# Altium footprint library Apalis Evaluation Board.PcbLib: 166 footprints (part 3 of 11)
Each footprint in its own frame and in the unit in brackets; x right, y up, seen from the top. Pads: shape width x height; smd on the part's side, far side on the other; paste and mask are expansions set on the pad; w line width, h text height; cw(c..) or ccw(c..) is an arc to the next point about the centre after c.
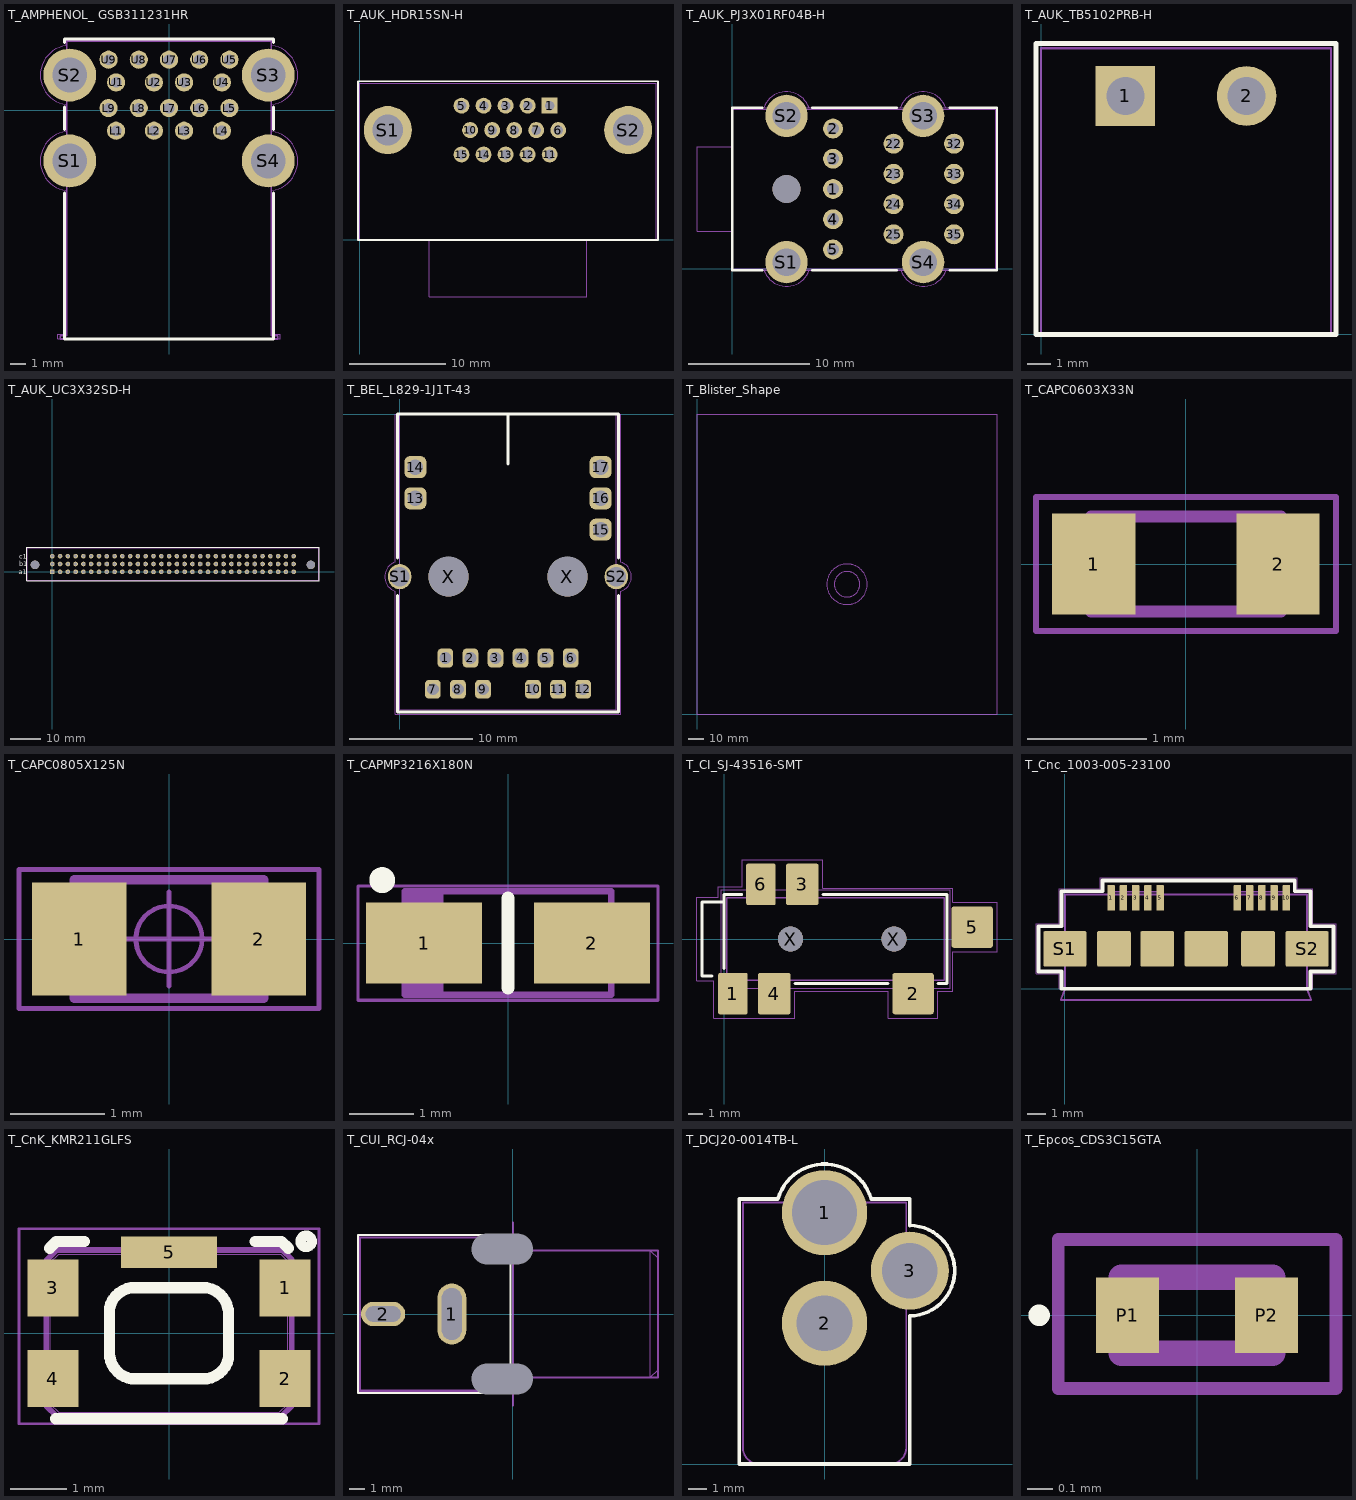
[diagram p2: the footprints below, top view; thin cyan lines are the x and y axes]

## T_AMPHENOL_ GSB311231HR [mm] "USB 3.0 double row, Type A"
height 15.5
pads (22):
  round 1.2 hole 0.7: L1(-3.5,-1.35) L2(-1,-1.35) L3(1,-1.35) L4(3.5,-1.35) L5(4,0.15) L6(2,0.15) L7(0,0.15) L8(-2,0.15) L9(-4,0.15) U1(-3.5,1.85) U2(-1,1.85) U3(1,1.85) U4(3.5,1.85) U5(4,3.35) U6(2,3.35) U7(0,3.35) U8(-2,3.35) U9(-4,3.35)
  round 3.5 hole 2.3: S1(-6.57,-3.35) S2(-6.57,2.33) S3(6.57,2.33) S4(6.57,-3.35)
Top Overlay:
  lines w0.2: -6.9,-5.48 -6.9,-15.13 6.9,-15.13 6.9,-5.48 ; -6.9,-1.28 -6.9,0.22 ; -6.9,4.5 -6.9,4.72 6.9,4.72 6.9,4.5 ; 6.9,-1.28 6.9,0.22
Mechanical 1:
  lines w0.05: -6.809,-5.293 -6.809,-14.83 -7.349,-14.83 -7.349,-15.13 7.349,-15.13 7.349,-14.83 6.81,-14.83 6.809,-5.292 ; -6.809,-1.405 -6.809,0.385 ; -6.809,-5.293 cw(c-6.565,-3.351) -6.809,-1.408 ; -6.809,0.387 cw(c-6.565,2.329) -6.809,4.272 -6.809,4.63 6.809,4.63 6.809,4.273 ; 6.809,-5.292 ccw(c6.565,-3.349) 6.809,-1.407 ; 6.809,0.388 ccw(c6.565,2.331) 6.809,4.273 ; 6.809,-1.405 6.809,0.385
Mechanical 2:
  lines w0.001: -6.753,4.57 6.747,4.57 ; -6.75,4.57 -6.75,-14.93 -7.2,-14.93 -7.2,-15.13 7.2,-15.13 7.2,-14.93 6.75,-14.93 6.75,4.57
Mechanical 3:
  lines w0.1: -7.2,-15.13 -7.2,-14.93 -6.75,-14.93 -6.75,4.57 6.75,4.57 6.75,-14.93 7.2,-14.93 7.2,-15.13 -7.2,-15.13

## T_AUK_HDR15SN-H [mm] "15 pin male D-SUB connector"
height 12.55
pads (17):
  rect 1.65x1.65 hole 1: 1(19.73,13.97)
  round 1.65 hole 1: 2(17.44,13.97) 3(15.15,13.97) 4(12.86,13.97) 5(10.57,13.97) 6(20.62,11.43) 7(18.33,11.43) 8(16.04,11.43) 9(13.75,11.43) 10(11.46,11.43) 11(19.73,8.89) 12(17.44,8.89) 13(15.15,8.89) 14(12.86,8.89) 15(10.57,8.89)
  round 5 hole 3.2: S1(2.9,11.43) S2(27.9,11.43)
Top Overlay:
  lines w0.2: -0.2,0 -0.2,16.505 31,16.505 31,0 -0.2,0
Mechanical 1:
  lines w0.05: 0,0 0,16.3 30.8,16.3 30.8,0 0,0
Mechanical 2:
  lines w0.001: 7.235,0 7.235,-5.9 23.565,-5.9 23.565,0 ; 30.8,0 30.8,16.3 0,16.3 0,0 30.819,0
Mechanical 3:
  lines w0.1: 0,0 30.8,0 30.8,16.3 0,16.3 0,0
3D body: height 12.6, standoff -3.17, extent -0.006,-5.893 30.81,16.231

## T_AUK_PJ3X01RF04B-H [mm] "Audio Jack Triple Stacked DIP Type"
height 37
pads (18):
  round 1.65 hole 1: 1(8.35,6.6) 2(8.35,11.6) 3(8.35,9.1) 4(8.35,4.1) 5(8.35,1.6) 22(13.35,10.35) 23(13.35,7.85) 24(13.35,5.35) 25(13.35,2.85) 32(18.35,10.35) 33(18.35,7.85) 34(18.35,5.35) 35(18.35,2.85)
  round 3.5 hole 2.3: S1(4.5,0.55) S2(4.5,12.65) S3(15.8,12.65) S4(15.8,0.55)
  round 2.3 hole 2.3 unplated: ""(4.5,6.6)
Top Overlay:
  lines w0.2: 0,-0.105 2.5,-0.105 ; 0,-0.082 0,13.305 2.5,13.305 ; 6.625,-0.105 13.625,-0.105 ; 6.625,13.305 13.625,13.305 ; 18,-0.105 21.903,-0.105 21.905,-0.105 21.905,13.305 18,13.305
Mechanical 1:
  lines w0.05: 2.604,13.299 cw(c4.484,12.666) 6.363,13.301 ; 2.604,13.3 0,13.3 0,-0.1 2.637,-0.1 ; 2.637,-0.101 ccw(c4.516,0.533) 6.396,-0.099 ; 6.363,13.3 13.904,13.3 ; 6.396,-0.1 13.937,-0.1 ; 13.904,13.299 cw(c15.784,12.666) 17.663,13.301 ; 13.937,-0.101 ccw(c15.816,0.533) 17.696,-0.099 ; 17.663,13.3 21.9,13.3 21.9,-0.1 17.696,-0.1
Mechanical 2:
  lines w0.001: 0,3.1 -2.9,3.1 -2.9,10.1 0,10.1 ; 0,0 0,13.2 21.8,13.2 21.8,0 0,0
Mechanical 3:
  lines w0.1: 0,-0.1 21.901,-0.1 ; 0,13.3 21.9,13.3 21.902,13.298 21.902,-0.1 ; 0.001,-0.074 0.001,13.326 ; 21.901,-0.1 21.902,-0.1
3D body: height 31.5, standoff 28.5, extent -2.905,5.105 0.01,8.093
3D body: height 19, standoff 16, extent -2.905,5.105 0.01,8.093
3D body: height 6.5, standoff 3.5, extent -2.905,5.105 0.01,8.093
3D body: height 21.01, standoff 13.99, extent -2.9,3.1 0,10.1
3D body: height 33.51, standoff 26.49, extent -2.9,3.1 0,10.1
3D body: height 8.51, standoff 1.49, extent -2.9,3.1 0,10.1
3D body: height 38.5, standoff 0, extent 0,0 21.8,13.2

## T_AUK_TB5102PRB-H [mm] "Power Connector 5.08mm pitch"
height 8.4
pads (2):
  rect 2.5x2.5 hole 1.6: 1(3.54,10)
  round 2.5 hole 1.6: 2(8.62,10)
Top Overlay:
  lines w0.2: -0.21,0 -0.21,12.2 12.37,12.2 12.37,0 -0.21,0
Mechanical 1:
  lines w0.05: 0,0 0,12 12.16,12 12.16,0 0,0
Mechanical 2:
  lines w0.001: 0,0 0,12 12.16,12 12.16,0 0,0
Mechanical 3:
  lines w0.1: 0,0 0,12 12.16,12 12.16,0 0,0
3D body: height 8.37, standoff -3.48, extent -0.16,0 11.82,12

## T_AUK_UC3X32SD-H [mm] "Header, 3x32 Pins, 2.54 mm pitch"
height 11.6
pads (98):
  rect 1.5x1.5 hole 1: A1(0,0)
  round 1.5 hole 1: A2(2.54,0) A3(5.08,0) A4(7.62,0) A5(10.16,0) A6(12.7,0) A7(15.24,0) A8(17.78,0) A9(20.32,0) A10(22.86,0) A11(25.4,0) A12(27.94,0) A13(30.48,0) A14(33.02,0) A15(35.56,0) A16(38.1,0) A17(40.64,0) A18(43.18,0) A19(45.72,0) A20(48.26,0) A21(50.8,0) A22(53.34,0) A23(55.88,0) A24(58.42,0) A25(60.96,0) A26(63.5,0) A27(66.04,0) A28(68.58,0) A29(71.12,0) A30(73.66,0) A31(76.2,0) A32(78.74,0) B1(0,2.54) B2(2.54,2.54) B3(5.08,2.54) B4(7.62,2.54) B5(10.16,2.54) B6(12.7,2.54) B7(15.24,2.54) B8(17.78,2.54) B9(20.32,2.54) B10(22.86,2.54) B11(25.4,2.54) B12(27.94,2.54) B13(30.48,2.54) B14(33.02,2.54) B15(35.56,2.54) B16(38.1,2.54) B17(40.64,2.54) B18(43.18,2.54) B19(45.72,2.54) B20(48.26,2.54) B21(50.8,2.54) B22(53.34,2.54) B23(55.88,2.54) B24(58.42,2.54) B25(60.96,2.54) B26(63.5,2.54) B27(66.04,2.54) B28(68.58,2.54) B29(71.12,2.54) B30(73.66,2.54) B31(76.2,2.54) B32(78.74,2.54) C1(0,5.08) C2(2.54,5.08) C3(5.08,5.08) C4(7.62,5.08) C5(10.16,5.08) C6(12.7,5.08) C7(15.24,5.08) C8(17.78,5.08) C9(20.32,5.08) C10(22.86,5.08) C11(25.4,5.08) C12(27.94,5.08) C13(30.48,5.08) C14(33.02,5.08) C15(35.56,5.08) C16(38.1,5.08) C17(40.64,5.08) C18(43.18,5.08) C19(45.72,5.08) C20(48.26,5.08) C21(50.8,5.08) C22(53.34,5.08) C23(55.88,5.08) C24(58.42,5.08) C25(60.96,5.08) C26(63.5,5.08) C27(66.04,5.08) C28(68.58,5.08) C29(71.12,5.08) C30(73.66,5.08) C31(76.2,5.08) C32(78.74,5.08)
  round 2.8 hole 2.8 unplated: ""(-5.63,2.24) ""(84.37,2.24)
Top Overlay:
  lines w0.2: -8.255,-2.885 -8.255,7.963 86.995,7.963 86.995,-2.885 -8.255,-2.885
  text "a1" at -10.847,-0.758 h1.52
  text "b1" at -10.84,1.778 h1.52
  text "c1" at -10.84,4.318 h1.52
Mechanical 1:
  lines w0.05: -8.205,-2.835 86.945,-2.835 86.945,7.915 -8.205,7.915 -8.205,-2.835
Mechanical 2:
  lines w0.001: -8.13,-2.71 86.87,-2.71 86.87,7.79 -8.13,7.79 -8.13,-2.71
Mechanical 3:
  lines w0.1: -8.13,-2.76 -8.13,7.84 86.87,7.84 86.87,-2.76 -8.13,-2.76
3D body: height 11.62, standoff -3.98, extent -8.13,-2.76 86.87,7.84

## T_BEL_L829-1J1T-43 [mil] "LOW PROFILE GIGABIT ETHERNET JACK WITH MAGS"
height 445
pads (21):
  rrect50% 50x60 hole 38: 1(146,-779.68) 2(226,-779.68) 3(306,-779.68) 4(386,-779.68) 5(466,-779.68) 6(546,-779.68) 7(106,-879.68) 8(186,-879.68) 9(266,-879.68) 10(426,-879.68) 11(506,-879.68) 12(586,-879.68)
  rrect50% 70x70 hole 50: 13(50,-269.69) 14(50,-169.69) 15(642,-369.69) 16(642,-269.69) 17(642,-169.69)
  oval 74x80 hole 62: S1(0,-519.68) S2(692,-519.68)
  round 128 hole 128 unplated: X(156,-519.68) X(536,-519.68)
Top Overlay:
  lines w10: -6.95,-579.68 -6.95,-951.77 699.02,-951.77 699.02,-579.68 ; -6.95,-459.49 -6.95,0 699.02,0 699.02,-460 ; 346,-159.69 346,-0.06 346.06,0
Mechanical 1:
  lines w1.97: -13.78,-473.23 -13.78,0 705.91,0 705.91,-473.24 ; -13.76,-473.28 ccw(c0.2,-519.71) -13.78,-566.13 -13.78,-958.66 705.91,-958.66 705.91,-566.09 ; 705.89,-566.05 ccw(c691.8,-519.66) 705.89,-473.28
Mechanical 2:
  lines w0.04: 0,-944.88 692.13,-944.88 692.13,0 0,0 0,-944.88
Mechanical 3:
  lines w3.94: 0,-944.88 692.13,-944.88 692.13,0 0,0 0,-944.88
3D body: height 494.05, standoff -150.89, extent -54.94,-946.68 746.36,19.67

## T_Blister_Shape [mm]
Mechanical 2:
  circle w0.254: c100,86.5 r8.5
  circle w0.254: c100,86.5 r13.5
Mechanical 15:
  lines w0.01: 0,0 200,0 200,200 0,200 0,0
3D body: height 24.9, standoff 22.4, extent 87.549,74.025 112.451,98.975
3D body: height 22.1, standoff 19.6, extent 88.047,74.524 111.953,98.476
3D body: height 19.3, standoff 16.8, extent 88.545,75.023 111.455,97.977
3D body: height 16.5, standoff 14, extent 89.043,75.522 110.957,97.478
3D body: height 13.7, standoff 11.2, extent 89.541,76.021 110.459,96.979
3D body: height 10.9, standoff 8.4, extent 90.039,76.52 109.961,96.48
3D body: height 27.7, standoff 25.2, extent 86.553,73.027 113.447,99.973
3D body: height 8.1, standoff 5.6, extent 90.537,77.019 109.463,95.981
3D body: height 5.3, standoff 2.8, extent 91.035,77.518 108.965,95.482
3D body: height 2.8, standoff 0, extent 91.534,78.017 108.466,94.983

## T_CAPC0603X33N [mm]
height 0.8
pads (2):
  rect 0.7x0.85 smd: 1(-0.775,0) 2(0.775,0)
Mechanical 1:
  lines w0.05: -1.261,-0.563 1.262,-0.563 1.262,0.563 -1.261,0.563 -1.261,-0.563
Mechanical 2:
  lines w0.001: -0.8,-0.4 0.8,-0.4 0.8,0.4 -0.8,0.4 -0.8,-0.4
Mechanical 3:
  lines w0.1: -0.8,-0.4 0.8,-0.4 0.8,0.4 -0.8,0.4 -0.8,-0.4
3D body: height 0.9, standoff 0, extent -0.8,-0.4 0.8,0.4

## T_CAPC0805X125N [mm]
height 1.25
pads (2):
  rect 1x1.2 smd: 1(-0.95,0) 2(0.95,0)
Mechanical 1:
  circle w0.05: c0,0 r0.35
  lines w0.05: -0.5,0 0.5,0 ; 0,-0.5 0,0.5 ; -1.586,-0.736 1.586,-0.736 1.586,0.736 -1.586,0.736 -1.586,-0.736
Mechanical 2:
  lines w0.001: -1,-0.625 -1,0.625 1,0.625 1,-0.625 -1,-0.625
Mechanical 3:
  lines w0.1: -1,-0.625 1,-0.625 1,0.625 -1,0.625 -1,-0.625
3D body: height 1.4, standoff 0, extent -1,-0.625 1,0.625

## T_CAPMP3216X180N [mm]
height 1.6
pads (2):
  rect 1.8x1.25 smd: 1(-1.3,0) 2(1.3,0)
Top Overlay:
  circle w0.3: c-1.95,0.975 r0.05
  lines w0.2: 0,-0.699 0,0.699
Mechanical 1:
  lines w0.05: -2.325,-0.886 2.325,-0.886 2.325,0.886 -2.325,0.886 -2.325,-0.886
Mechanical 2:
  lines w0.001: -1.6,-0.8 -1.6,0.8 1.6,0.8 1.6,-0.8 -1.6,-0.8
Mechanical 3:
  lines w0.1: -1.55,-0.8 -1.55,0.8 ; -1.45,-0.8 -1.45,0.8 ; -1.35,-0.8 -1.35,0.8 ; -1.25,-0.8 -1.25,0.8 ; -1.15,-0.8 -1.15,0.8 ; -1.05,-0.8 -1.05,0.8 ; -1.6,-0.8 -1.6,0.8 1.6,0.8 1.6,-0.8 -1.6,-0.8
3D body: height 1.6, standoff 0, extent -1.6,-0.8 -1,0.8
3D body: height 1.6, standoff 0, extent -1,-0.8 1.6,0.8

## T_CI_SJ-43516-SMT [mm] "STEREO_3.5mm AUDIO JACK  CUI"
height 5
pads (8):
  rrect12% 2x2.8 smd: 1(0.6,-3.7) 6(2.5,3.7)
  rrect12% 2.8x2.8 smd: 2(12.8,-3.7) 5(16.8,0.8)
  rrect12% 2.2x2.8 smd: 3(5.3,3.7) 4(3.4,-3.7)
  round 1.7 hole 1.7 unplated: X(4.5,0) X(11.5,0)
Top Overlay:
  lines w0.2: -0.8,-2.5 -1.5,-2.5 -1.5,2.5 0,2.5 ; 0,-2 0,3 1.2,3 ; 4.8,-3 11.1,-3 ; 6.7,3 15.1,3 15.1,-3 14.5,-3
Mechanical 1:
  lines w0.05: -1.83,-2.83 -0.68,-2.83 -0.68,-5.38 4.78,-5.38 4.78,-3.53 11.12,-3.53 11.12,-5.38 14.48,-5.38 14.48,-3.53 15.48,-3.53 15.48,-0.87 18.48,-0.87 18.48,2.48 15.48,2.48 15.48,3.45 6.68,3.45 6.68,5.38 1.22,5.38 1.22,3.53 -0.39,3.53 -0.39,2.83 -1.83,2.83 -1.83,-2.83
Mechanical 2:
  lines w0.001: -0.2,-3.35 15.3,-3.35 15.3,3.35 -0.2,3.35 -0.2,-3.35
Mechanical 3:
  lines w0.1: 0.2,-2.8 0.2,2.8 14.9,2.8 14.9,-2.8 0.2,-2.8

## T_Cnc_1003-005-23100 [mm] "USB Micro A/B 3.0"
height 2.92
pads (16):
  rrect12% 0.4x1.35 smd: 1(2.45,4.825) 2(3.1,4.825) 3(3.75,4.825) 4(4.4,4.825) 5(5.05,4.825) 6(9.15,4.825) 7(9.8,4.825) 8(10.45,4.825) 9(11.1,4.825) 10(11.75,4.825)
  rrect12% 2.3x1.9 smd: S1(0,2.125) S2(12.85,2.125) ""(7.5,2.125)
  rrect12% 1.8x1.9 smd: ""(2.6,2.125) ""(4.9,2.125) ""(10.25,2.125)
Top Overlay:
  lines w0.2: -1.4,0.925 -0.175,0.925 -0.175,0 13.025,0 13.025,0.925 14.25,0.925 14.25,3.325 13.025,3.325 13.025,5.175 12.2,5.175 12.2,5.755 2,5.755 2,5.175 -0.175,5.175 -0.175,3.325 -1.4,3.325 -1.4,0.925
Mechanical 1:
  lines w0.05: -1.535,0.79 -0.31,0.79 -0.31,0 13.16,0 13.16,0.79 14.385,0.79 14.385,3.46 13.16,3.46 13.16,5.31 12.335,5.31 12.335,5.89 1.865,5.89 1.865,5.31 -0.31,5.31 -0.31,3.46 -1.535,3.46 -1.535,0.79
Mechanical 2:
  lines w0.001: 0,1.675 -0.64,1.675 -0.64,2.575 0,2.575 ; 2.35,5 2.35,5.15 5.15,5.15 5.15,5 ; 9.05,5 9.05,5.15 11.85,5.15 11.85,5 ; 12.85,1.675 13.49,1.675 13.49,2.575 12.85,2.575 ; 0,0 12.85,0 ; 0,0 -0.22,-0.6 13.07,-0.6 12.85,0 ; 0,0 0,5 12.85,5 12.85,0
Mechanical 3:
  lines w0.1: 0,1.675 -0.64,1.675 -0.64,2.575 0,2.575 ; 2.35,5 2.35,5.15 5.15,5.15 5.15,5 ; 9.05,5 9.05,5.15 11.85,5.15 11.85,5 ; 12.85,1.675 13.49,1.675 13.49,2.575 12.85,2.575 ; 0,0 12.85,0 ; 0,0 0,5 12.85,5 12.85,0 ; 0,0 -0.22,-0.6 13.07,-0.6 12.85,0
3D body: height 2.78, standoff -0.24, extent -0.65,-0.624 13.5,5.05

## T_CnK_KMR211GLFS [mm] "Microminiature Tact Switch for SMT"
height 1.9
pads (5):
  rect 0.9x1 smd: 1(2.05,0.8) 2(2.05,-0.8) 3(-2.05,0.8) 4(-2.05,-0.8)
  rect 1.7x0.55 smd: 5(0,1.43)
Top Overlay:
  circle w0.18: c2.424,1.624 r0.1
  lines w0.2: -2.109,1.502 -1.991,1.62 -1.5,1.62 ; -2,-1.51 2,-1.51 ; -1.05,-0.36 -1.05,0.44 ; -1.05,-0.35 ccw(c-0.59,-0.35) -0.662,-0.804 ; -1.05,0.444 cw(c-0.6,0.35) -0.669,0.805 ; -0.66,0.805 0.66,0.805 ; -0.655,-0.805 0.65,-0.805 ; 0.669,-0.805 ccw(c0.6,-0.35) 1.05,-0.444 ; 0.684,0.8 cw(c0.59,0.35) 1.045,0.419 ; 1.05,-0.44 1.05,0.4 ; 1.52,1.621 1.989,1.621 2.108,1.502
Mechanical 1:
  lines w0.05: -2.65,-1.6 -2.65,1.845 2.65,1.845 2.65,-1.6 -2.65,-1.6
Mechanical 2:
  lines w0.001: -2.1,-1.25 -2.1,1.25 -1.95,1.4 1.97,1.4 2.1,1.27 2.1,-1.25 1.95,-1.4 -1.95,-1.4 -2.1,-1.25
Mechanical 3:
  lines w0.1: -2.17,-1.28 -2.17,1.28 -1.98,1.47 2,1.47 2.17,1.3 2.17,-1.28 1.98,-1.47 -1.98,-1.47 -2.17,-1.28

## T_CUI_RCJ-04x [mm] "Right Angle RCA Connector THT"
height 12.6
pads (4):
  oval 1.9x4 hole 1.3 slot 3.4 at 90 deg: 1(-4,0)
  oval 2.9x1.6 hole 1 slot 2.3 at 0 deg: 2(-8.5,0)
  round 0 hole 2 slot 4 at 0 deg: Hole1(-0.7,4.25) Hole2(-0.7,-4.25)
Top Overlay:
  lines w0.127: -0.147,5.165 -10.143,5.165 -10.143,-5.165 -0.146,-5.165 -0.146,5.144
Mechanical 1:
  lines w0.127: -10.123,-5.152 -10.123,5.185 0,5.185 0,-5.152 -10.123,-5.152
Mechanical 2:
  lines w0: 0,-5 0,5
  lines w0.001: 0,-5 -10,-5 -10,5 0,5 ; 0,-4.15 9,-4.15 ; 0,4.15 9,4.15 ; 9,-4.15 9,4.15 ; 9,-4.15 9.5,-3.65 9.5,3.65 9,4.15
Mechanical 3:
  lines w0.127: 0,-6 0,6 ; 0,-4.15 9.5,-4.15 9.5,4.15 0,4.15 ; -10,-5 -10,5 0,5 0,-5 -10,-5

## T_DCJ20-0014TB-L [mm] "Header, 1x2 Pins, 2.54 mm pitch, male"
height 10.7
pads (3):
  round 4.7 hole 3.58: 1(0,13.85)
  round 4.7 hole 3.07: 2(0,7.75)
  round 4.3 hole 3.07: 3(4.7,10.65)
Top Overlay:
  lines w0.2: -2.569,14.598 cw(c0,13.85) 2.569,14.6 4.7,14.6 4.7,13.142 cw(c4.675,10.65) 4.7,8.158 ; -2.569,14.6 -4.7,14.6 -4.7,0 4.675,0 ; 4.7,0 4.7,8.157
Mechanical 1:
  lines w0.05: 4.675,0 -4.7,0 -4.7,14.6 -2.568,14.6 cw(c0,13.85) 2.568,14.6 4.7,14.6 4.7,13.125 cw(c4.7,10.65) 4.7,8.175 4.7,0
Mechanical 2:
  lines w0.001: -1.4,13.95 -1.4,14.4 -4.5,14.4 -4.5,0.9 ccw(c-3.6,0.9) -3.6,0 3.6,0 ; 1.4,13.95 1.4,14.4 4.5,14.4 4.5,0.9 cw(c3.6,0.9) 3.6,0
Mechanical 3:
  lines w0.1: -4.5,0.9 ccw(c-3.6,0.9) -3.6,0 3.6,0 ccw(c3.6,0.9) 4.5,0.9 4.5,14.4 -4.5,14.4 -4.5,0.9
3D body: height 10.7, standoff 0, extent -4.5,0 4.5,14.4
3D body: height 4, standoff -3.7, extent 4.5,9.45 4.7,11.85
3D body: height 4, standoff -3.7, extent -1.2,7.65 1.2,7.85
3D body: height 4, standoff -3.7, extent -1.4,13.75 1.4,13.95
3D body: height 9.59, standoff 3.21, extent -3.2,0 3.175,2
3D body: height 7.4, standoff 5.4, extent -1,0 0.992,2

## T_Epcos_CDS3C15GTA [mm] "Bidirectional ESD Protection"
height 0.27
pads (2):
  rect 0.25x0.3 smd: P1(-0.275,0) P2(0.275,0)
Top Overlay:
  circle w0.06: c-0.625,0 r0.012
Mechanical 1:
  lines w0.05: -0.55,-0.29 0.55,-0.29 0.55,0.3 -0.55,0.3 -0.55,-0.29
Mechanical 2:
  lines w0.001: -0.315,-0.165 0.315,-0.165 0.315,0.165 -0.315,0.165 -0.315,-0.165
Mechanical 3:
  lines w0.1: -0.3,-0.15 0.3,-0.15 0.3,0.15 -0.3,0.15 -0.3,-0.15
3D body: height 0.27, standoff 0, extent -0.315,-0.165 0.315,0.165